# Altium footprint library my_AP_lib_pcb.PcbLib: 115 footprints (part 2 of 8)
Each footprint in its own frame and in the unit in brackets; x right, y up, seen from the top. Pads: shape width x height; smd on the part's side, far side on the other; paste and mask are expansions set on the pad; w line width, h text height; cw(c..) or ccw(c..) is an arc to the next point about the centre after c.
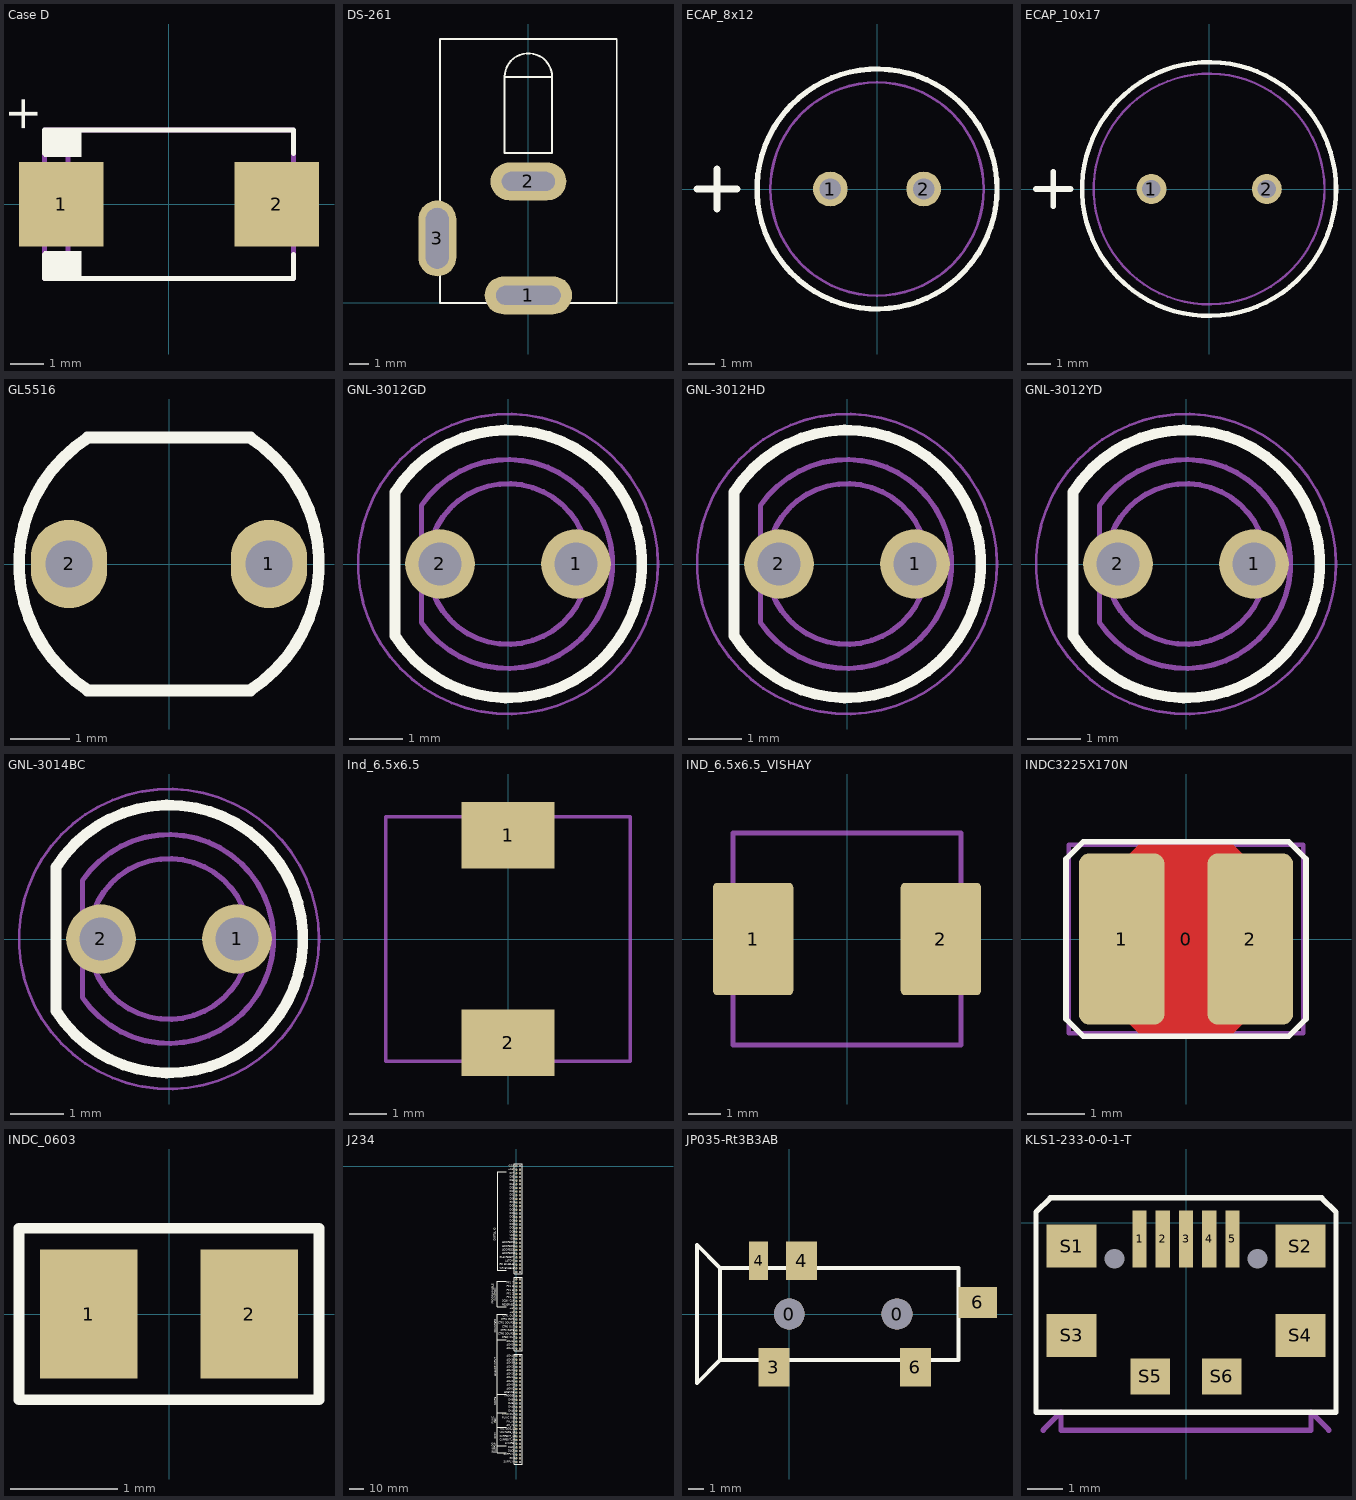
[diagram p1: the footprints below, top view; thin cyan lines are the x and y axes]

## Case D [mm]
pads (2):
  rect 2.5x2.5 smd mask+0.07: 1(-3.2,0) 2(3.2,0)
Top Overlay:
  region: -3.7,1.4 -2.6,1.4 -2.6,2.2 -3.7,2.2
  region: -3.7,-1.4 -2.6,-1.4 -2.6,-2.2 -3.7,-2.2
  lines w0.15: -3.7,-1.5 -3.7,-2.2 3.7,-2.2 3.7,-1.5 ; -3.7,1.5 -3.7,2.2 3.7,2.2 3.7,1.5
  text "+" at -3.9,2.1 h1
Mechanical 15:
  lines w0.15: -3,-2.2 -3,2.2 ; -3.7,-2.2 -3.7,2.2 3.7,2.2 3.7,-2.2 -3.7,-2.2
  text ".Designator" at -1.6,-0.1 h0.5
3D body "User Library-AVX_D_CASE.step": height 3.01, standoff 0, extent -3.7,-2.225 3.7,2.225

## DS-261 [mm]
height 1
pads (3):
  oval 4.6x2 hole 1 slot 3.4 at 0 deg: 1(0,0.4)
  oval 4x2 hole 1 slot 2.8 at 0 deg: 2(0,6.4)
  oval 2x4 hole 1.2 slot 3.2 at 90 deg: 3(-4.8,3.4)
Top Overlay:
  lines w0.1: -1.25,11.9 cw(c0,11.9) 1.25,11.9 ; -1.25,11.9 1.25,11.9 ; -1.25,11.9 -1.25,7.9 1.25,7.9 1.25,11.9 ; -4.65,0 -4.65,13.9 4.65,13.9 4.65,0 -4.65,0
3D body "DS-261A.step": height 11, standoff -4.1, extent -4.65,0 4.65,13.9

## ECAP_8x12 [mm]
pads (2):
  round 1.3 hole 0.8: 1(-1.75,0) 2(1.75,0)
Top Overlay:
  circle w0.2: c0,0 r4.5
  lines w0.254: -6.75,0 -5.25,0 ; -6,-0.75 -6,0.75
Mechanical 3:
  circle w0.1: c0,0 r4
3D body: height 12, standoff 0, extent -4,-4 4,4

## ECAP_10x17 [mm]
pads (2):
  round 1.3 hole 0.8: 1(-2.5,0) 2(2.5,0)
Top Overlay:
  circle w0.2: c0,0 r5.5
  lines w0.254: -7.5,0 -6,0 ; -6.75,-0.75 -6.75,0.75
Mechanical 3:
  circle w0.1: c0,0 r5
3D body: height 17, standoff 0, extent -5,-5 5,5

## GL5516 [mm]
pads (2):
  oval 1.3x1.5 hole 0.8 mask+0.05: 1(1.7,0) 2(-1.7,0)
Top Overlay:
  lines w0.2: -1.389,-2.15 1.389,-2.15 ; -1.389,-2.139 cw(c0,0) -1.389,2.139 ; -1.389,2.15 1.389,2.15 ; 1.389,-2.139 ccw(c0,0) 1.389,2.139
3D body "User Library-5506Photoresistor.STEP": height 2.7, standoff -1.3, extent -2.55,-2.15 2.55,2.15

## GNL-3012GD [mm]
height 20
pads (2):
  round 1.3 hole 0.8 mask+0.05: 1(1.27,0) 2(-1.27,0)
Top Overlay:
  lines w0.2: -2.109,-1.342 ccw(c0,0) -2.109,1.342 -2.109,-1.342
Mechanical 1:
  circle w0.1: c0,0 r1.5
  circle w0.05: c0,0 r2.8
  lines w0.1: -1.615,-1.093 ccw(c0,0) -1.615,1.093 -1.615,-1.093
  text ".Designator" at -1.75,-1 h2
3D body "everlight-3MM-LED-GREEN.STEP": height 5.44, standoff -7.13, extent -1.526,-1.9 1.9,1.9

## GNL-3012HD [mm]
height 20
pads (2):
  round 1.3 hole 0.8 mask+0.05: 1(1.27,0) 2(-1.27,0)
Top Overlay:
  lines w0.2: -2.109,-1.342 ccw(c0,0) -2.109,1.342 -2.109,-1.342
Mechanical 1:
  circle w0.1: c0,0 r1.5
  circle w0.05: c0,0 r2.8
  lines w0.1: -1.615,-1.093 ccw(c0,0) -1.615,1.093 -1.615,-1.093
  text ".Designator" at -1.75,-1 h2
3D body "everlight-3MM-LED-RED.STEP": height 5.44, standoff -7.13, extent -1.526,-1.9 1.9,1.9

## GNL-3012YD [mm]
height 20
pads (2):
  round 1.3 hole 0.8 mask+0.05: 1(1.27,0) 2(-1.27,0)
Top Overlay:
  lines w0.2: -2.109,-1.342 ccw(c0,0) -2.109,1.342 -2.109,-1.342
Mechanical 1:
  circle w0.05: c0,0 r2.8
  circle w0.1: c0,0 r1.5
  lines w0.1: -1.615,-1.093 ccw(c0,0) -1.615,1.093 -1.615,-1.093
  text ".Designator" at -1.75,-1 h2
3D body "everlight-3MM-LED-YELLOW.STEP": height 5.44, standoff -7.13, extent -1.526,-1.9 1.9,1.9

## GNL-3014BC [mm]
height 20
pads (2):
  round 1.3 hole 0.8 mask+0.05: 1(1.27,0) 2(-1.27,0)
Top Overlay:
  lines w0.2: -2.109,-1.342 ccw(c0,0) -2.109,1.342 -2.109,-1.342
Mechanical 1:
  circle w0.05: c0,0 r2.8
  circle w0.1: c0,0 r1.5
  lines w0.1: -1.615,-1.093 ccw(c0,0) -1.615,1.093 -1.615,-1.093
  text ".Designator" at -1.75,-1 h2
3D body "everlight-3MM-LED-BLUE.STEP": height 5.44, standoff -7.13, extent -1.526,-1.9 1.9,1.9

## Ind_6.5x6.5 [mm]
pads (2):
  rect 2.5x1.8 smd: 1(0,2.8) 2(0,-2.8)
Mechanical 15:
  lines w0.1: -3.3,-3.3 3.3,-3.3 3.3,3.3 -3.3,3.3 -3.3,-3.3
  text ".Designator" at -1.8,-0.2 h0.5
3D body "srr0604-6r8ml.stp": height 4.8, standoff 0, extent -3.25,-3.25 3.25,3.25

## IND_6.5x6.5_VISHAY [mm]
height 3
pads (2):
  rrect10% 2.5x3.5 smd mask+0.07: 1(-2.925,0) 2(2.925,0)
Mechanical 15:
  lines w0.15: -3.556,-3.302 3.556,-3.302 3.556,3.302 -3.556,3.302 -3.556,2.286 -3.556,-3.302
  text ".Designator" at -1.927,-0.2 h0.5
3D body "ihlp2525czer1r0m11.stp": height 2.89, standoff 0, extent -3.538,-3.37 3.538,3.3

## INDC3225X170N [mm] "Chip Inductor, 2-Leads, Body 3.2x2.5mm, IPC Medium Density"
height 1.7
pads (3):
  round 0.508 on Mech15: 0(0,0)
  rrect25% 1.5x3 smd: 1(-1.125,0) 2(1.125,0)
Top Layer:
  pour cut-out: -1.125,1.35 -0.825,1.65 0.825,1.65 1.125,1.35 1.125,-1.35 0.825,-1.65 -0.825,-1.65 -1.125,-1.35
Top Overlay:
  lines w0.1: -2.1,-1.4 -2.1,1.4 -1.8,1.7 1.8,1.7 2.1,1.4 2.1,-1.4 1.8,-1.7 -1.8,-1.7 -2.1,-1.4
Mechanical 13:
  lines w0.05: -1.7,-1.35 1.7,-1.35 1.7,1.35 -1.7,1.35 -1.7,-1.35
Mechanical 15:
  lines w0.076: -2.05,-1.65 -2.05,1.65 2.05,1.65 2.05,-1.65 -2.05,-1.65
3D body "INDC3225X170N.STEP": height 1.7, standoff 0, extent -1.71,-1.36 1.71,1.36

## INDC_0603 [mm] "Chip Inductor, 2-Leads, Body 1,60x1,00mm, IPC Medium Density"
height 1
pads (2):
  rect 0.91x1.2 smd: 1(-0.75,0) 2(0.75,0)
Top Overlay:
  lines w0.1: -1.4,-0.8 -1.4,0.8 1.4,0.8 1.4,-0.8 -1.4,-0.8
Mechanical 15:
  lines w0.05: -1.4,-0.8 1.4,-0.8 1.4,0.8 -1.4,0.8 -1.4,-0.8
  text ".Designator" at -1.1,-0.2 h0.5
3D body "Coilcraft-0603ME.step": height 0.83, standoff -0.01, extent -0.9,-0.589 0.9,0.589

## J234 [mm]
pads (160):
  round 1.6 hole 1.1 mask+0.05: 1(0,0) 1(2.54,0) 2(0,-2.54) 2(2.54,-2.54) 3(0,-5.08) 3(2.54,-5.08) 4(0,-7.62) 4(2.54,-7.62) 5(0,-10.16) 5(2.54,-10.16) 6(0,-12.7) 6(2.54,-12.7) 7(0,-15.24) 7(2.54,-15.24) 8(0,-17.78) 8(2.54,-17.78) 9(0,-20.32) 9(2.54,-20.32) 10(0,-22.86) 10(2.54,-22.86) 11(0,-25.4) 11(2.54,-25.4) 12(0,-27.94) 12(2.54,-27.94) 13(0,-30.48) 13(2.54,-30.48) 14(0,-33.02) 14(2.54,-33.02) 15(0,-35.56) 15(2.54,-35.56) 16(0,-38.1) 16(2.54,-38.1) 17(0,-40.64) 17(2.54,-40.64) 18(0,-43.18) 18(2.54,-43.18) 19(0,-45.72) 19(2.54,-45.72) 20(0,-48.26) 20(2.54,-48.26) 21(0,-50.8) 21(2.54,-50.8) 22(0,-53.34) 22(2.54,-53.34) 23(0,-55.88) 23(2.54,-55.88) 24(0,-58.42) 24(2.54,-58.42) 25(0,-60.96) 25(2.54,-60.96) 26(0,-63.5) 26(2.54,-63.5) 27(0,-66.04) 27(2.54,-66.04) 28(0,-68.58) 28(2.54,-68.58) 29(0,-71.12) 29(2.54,-71.12) 30(0,-73.66) 30(2.54,-73.66) 31(0,-78.74) 31(2.54,-78.74) 32(0,-81.28) 32(2.54,-81.28) 33(0,-83.82) 33(2.54,-83.82) 34(0,-86.36) 34(2.54,-86.36) 35(0,-88.9) 35(2.54,-88.9) 36(0,-91.44) 36(2.54,-91.44) 37(0,-93.98) 37(2.54,-93.98) 38(0,-96.52) 38(2.54,-96.52) 39(0,-99.06) 39(2.54,-99.06) 40(0,-101.6) 40(2.54,-101.6) 41(0,-104.14) 41(2.54,-104.14) 42(0,-106.68) 42(2.54,-106.68) 43(0,-109.22) 43(2.54,-109.22) 44(0,-111.76) 44(2.54,-111.76) 45(0,-114.3) 45(2.54,-114.3) 46(0,-116.84) 46(2.54,-116.84) 47(0,-119.38) 47(2.54,-119.38) 48(0,-121.92) 48(2.54,-121.92) 49(0,-124.46) 49(2.54,-124.46) 50(0,-127) 50(2.54,-127) 51(0,-132.08) 51(2.54,-132.08) 52(0,-134.62) 52(2.54,-134.62) 53(0,-137.16) 53(2.54,-137.16) 54(0,-139.7) 54(2.54,-139.7) 55(0,-142.24) 55(2.54,-142.24) 56(0,-144.78) 56(2.54,-144.78) 57(0,-147.32) 57(2.54,-147.32) 58(0,-149.86) 58(2.54,-149.86) 59(0,-152.4) 59(2.54,-152.4) 60(0,-154.94) 60(2.54,-154.94) 61(0,-157.48) 61(2.54,-157.48) 62(0,-160.02) 62(2.54,-160.02) 63(0,-162.56) 63(2.54,-162.56) 64(0,-165.1) 64(2.54,-165.1) 65(0,-167.64) 65(2.54,-167.64) 66(0,-170.18) 66(2.54,-170.18) 67(0,-172.72) 67(2.54,-172.72) 68(0,-175.26) 68(2.54,-175.26) 69(0,-177.8) 69(2.54,-177.8) 70(0,-180.34) 70(2.54,-180.34) 71(0,-182.88) 71(2.54,-182.88) 72(0,-185.42) 72(2.54,-185.42) 73(0,-187.96) 73(2.54,-187.96) 74(0,-190.5) 74(2.54,-190.5) 75(0,-193.04) 75(2.54,-193.04) 76(0,-195.58) 76(2.54,-195.58) 77(0,-198.12) 77(2.54,-198.12) 78(0,-200.66) 78(2.54,-200.66) 79(0,-203.2) 79(2.54,-203.2) 80(0,-205.74) 80(2.54,-205.74)
Top Overlay:
  lines w0.2: -13.3,-194.32 -7,-194.32 ; -13.3,-181.62 -7,-181.62 ; -13.3,-171.46 -7,-171.46 ; -13.3,-158.76 -7,-158.76 ; -13.3,-120.66 -7,-120.66 ; -7,-199.4 -13.3,-199.4 -13.3,-102.88 -7,-102.88 ; -7,-97.8 -13.3,-97.8 -13.3,-80.02 -7,-80.02 ; -7,-72.4 -13.3,-72.4 -13.3,-3.82 -7,-3.82 ; -1.5,-207.14 -1.5,-130.68 4.04,-130.68 4.04,-207.14 -1.5,-207.14 ; -1.5,-128.4 -1.5,-77.34 4.04,-77.34 4.04,-128.4 -1.5,-128.4 ; -1.5,-75.06 -1.5,1.4 4.04,1.4 4.04,-75.06 -1.5,-75.06
  text "GEN" at -13.9,-178.7 h1
  text "FUNC" at -15.6,-179.2 h1
  text "DMM" at -14,-189.5 h1
  text "ANALOG INPUT" at -14,-146.3 h1
  text "DIGITAL IO" at -14.2,-52.1 h1
  text "3-WIRE" at -7.6,-193.5 h1
  text "CURRENT_HI" at -11.7,-191.1 h1
  text "CURRENT_LO" at -11.7,-188.46 h1
  text "VOLTAGE_HI" at -11.7,-185.9 h1
  text "AM_IN" at -6.6,-180.8 h1
  text "FM_IN" at -6.6,-178.3 h1
  text "CHA-" at -5.7,-170.7 h1
  text "CHA+" at -5.7,-168.2 h1
  text "CHB-" at -5.7,-165.5 h1
  text "CHB+" at -5.7,-163 h1
  text "TRIGGER" at -8.6,-160.52 h1
  text "AIGND" at -6.7,-155.4 h1
  text "CTR0 SOURSE" at -12.7,-117.34 h1
  text "CTR0 GATE" at -10.7,-114.8 h1
  text "CTR0 OUT" at -9.7,-112.26 h1
  text "FREQ OUT" at -9.7,-119.88 h1
  text "CTR1 SOURSE" at -12.6,-109.72 h1
  text "CTR1 GATE" at -10.6,-107.2 h1
  text "+5V" at -4.7,-102.2 h1
  text "+5V" at -4.7,-99.6 h1
  text "RESERVED" at -9.7,-97.02 h1
  text "SCAN CLK" at -9.7,-94.48 h1
  text "ADDRESS0" at -9.7,-61.46 h1
  text "ADDRESS1" at -9.7,-58.9 h1
  text "ADDRESS2" at -9.7,-56.38 h1
  text "ADDRESS3" at -9.7,-53.84 h1
  text "VDD" at -4.7,-51.3 h1
  text "VDD" at -4.7,-48.76 h1
  text "-15V" at -5.6,-0.5 h1
  text "+15V" at -5.6,-3.04 h1
  text "DI7" at -4.6,-5.58 h1
  text "DI6" at -4.6,-8.12 h1
  text "DI5" at -4.6,-10.66 h1
  text "DI4" at -4.6,-13.2 h1
  text "DI3" at -4.6,-15.74 h1
  text "DI2" at -4.6,-18.28 h1
  text "DI1" at -4.6,-20.8 h1
  text "DI0" at -4.6,-23.36 h1
  text "GND" at -4.7,-25.9 h1
  text "DO7" at -4.7,-28.44 h1
  text "DO6" at -4.7,-30.98 h1
  text "DO5" at -4.7,-33.52 h1
  text "DO4" at -4.7,-36.06 h1
  text "DO3" at -4.7,-38.6 h1
  text "DO2" at -4.7,-41.14 h1
  text "DO1" at -4.7,-43.6 h1
  text "DO0" at -4.7,-46.22 h1
  text "GLB RESET*" at -11.7,-64.1 h1
  text "RD ENABLE*" at -11.7,-69.08 h1
  text "WR ENABLE*" at -11.7,-71.62 h1
  text "LATCH*" at -7.7,-66.54 h1
  text "PF1 7" at -6.6,-81.8 h1
  text "PF1 6" at -6.6,-84.3 h1
  text "PF1 5" at -6.6,-86.9 h1
  text "PF1 2" at -6.6,-89.4 h1
  text "PF1 1" at -6.6,-92 h1
  text "CTR1 OUT" at -9.6,-104.7 h1
  text "ACH5-" at -6.7,-122.4 h1
  text "ACH5+" at -6.7,-124.9 h1
  text "ACH4-" at -6.7,-127.4 h1
  text "ACH4+" at -6.7,-132.5 h1
  text "ACH3-" at -6.7,-135.2 h1
  text "ACH3+" at -6.7,-137.5 h1
  text "ACH2-" at -6.7,-140.2 h1
  text "ACH2+" at -6.7,-142.7 h1
  text "ACH1-" at -6.7,-145.2 h1
  text "ACH1+" at -6.7,-147.7 h1
  text "ACH0-" at -6.7,-150.3 h1
  text "ACH0+" at -6.7,-152.8 h1
  text "AISENSE" at -8.6,-157.9 h1
  text "SYNC OUT" at -9.8,-173.32 h1
  text "FUNC OUT" at -9.8,-175.76 h1
  text "VOLTAGE_LO" at -11.7,-183.38 h1
  text "DAC1" at -5.7,-196.1 h1
  text "DAC0" at -5.7,-198.7 h1
  text "SUPPLY-" at -8.7,-201.16 h1
  text "SUPPLY+" at -8.7,-206.34 h1
  text "GND" at -4.7,-203.7 h1
  text "FUNCTION" at -14,-93.5 h1
  text "PROGRAMMABLE" at -15.7,-95.6 h1
  text "COUNTERS" at -14,-115.8 h1
  text "SCOPE" at -14,-166.4 h1
  text "ANALOG" at -15.6,-199.6 h1
  text "OUTPUT" at -14,-199.6 h1
3D body "User Library-PBS-10.step": height 8.4, standoff -3.2, extent -1.27,-24.13 1.27,1.27
3D body "User Library-PBS-10.step": height 8.4, standoff -3.2, extent 1.27,-24.13 3.81,1.27
3D body "User Library-PBS-10.step": height 8.4, standoff -3.2, extent -1.27,-49.53 1.27,-24.13
3D body "User Library-PBS-10.step": height 8.4, standoff -3.2, extent 1.27,-49.53 3.81,-24.13
3D body "User Library-PBS-10.step": height 8.4, standoff -3.2, extent -1.27,-74.93 1.27,-49.53
3D body "User Library-PBS-10.step": height 8.4, standoff -3.2, extent 1.27,-74.93 3.81,-49.53
3D body "User Library-PBS-10.step": height 8.4, standoff -3.2, extent -1.27,-102.87 1.27,-77.47
3D body "User Library-PBS-10.step": height 8.4, standoff -3.2, extent 1.27,-102.87 3.81,-77.47
3D body "User Library-PBS-10.step": height 8.4, standoff -3.2, extent -1.27,-128.27 1.27,-102.87
3D body "User Library-PBS-10.step": height 8.4, standoff -3.2, extent 1.27,-128.27 3.81,-102.87
3D body "User Library-PBS-10.step": height 8.4, standoff -3.2, extent -1.27,-156.21 1.27,-130.81
3D body "User Library-PBS-10.step": height 8.4, standoff -3.2, extent 1.27,-156.21 3.81,-130.81
3D body "User Library-PBS-10.step": height 8.4, standoff -3.2, extent -1.27,-181.61 1.27,-156.21
3D body "User Library-PBS-10.step": height 8.4, standoff -3.2, extent 1.27,-181.61 3.81,-156.21
3D body "User Library-PBS-10.step": height 8.4, standoff -3.2, extent -1.27,-207.01 1.27,-181.61
3D body "User Library-PBS-10.step": height 8.4, standoff -3.2, extent 1.27,-207.01 3.81,-181.61

## JP035-Rt3B3AB [mm]
pads (7):
  round 2 hole 2 unplated mask+0.05: 0(0,0) 0(7,0)
  rect 2x2.5 smd: 3(-1,-3.45) 4(0.8,3.45) 6(8.2,-3.45)
  rect 1.25x2.5 smd: 4(-2,3.45)
  rect 2.5x2 smd: 6(12.25,0.75)
Top Overlay:
  lines w0.254: -4.5,-3 -6,-4.5 -6,4.5 -4.5,3 ; -4.5,-3 -4.5,-3 ; -4.5,-3 -4.5,3 ; -4.5,-3 11,-3 11,3 -4.5,3 ; -4.5,3 -4.5,3
3D body "User Library-35RASMT4BHNTRX.STEP": height 5.2, standoff -0.8, extent -6,-4.5 13,4.5

## KLS1-233-0-0-1-T [mm] "Micro USB 5S-B"
height 2.61
pads (13):
  rect 0.4x1.6 smd: 1(-1.3,-0.45) 2(-0.65,-0.45) 3(0,-0.45) 4(0.65,-0.45) 5(1.3,-0.45)
  round 0 hole 0.55 unplated: 20(-2,-1) 20(2,-1)
  rect 1.4x1.2 smd: S1(-3.2,-0.65) S2(3.2,-0.65) S3(-3.2,-3.15) S4(3.2,-3.15)
  rect 1.1x1 smd: S5(-1,-4.3) S6(1,-4.3)
Top Overlay:
  lines w0.15: -4.2,-5.3 4.2,-5.3 4.2,0.3 3.8,0.7 -3.8,0.7 -4.2,0.3 -4.2,-5.3
Mechanical 15:
  lines w0.15: -4,-5.8 -3.5,-5.3 -3.5,-5.8 3.5,-5.8 3.5,-5.3 4,-5.8